# Altium integrated library Jack_LibraryLibPkg.IntLib: 77 symbols (continued)
## BLM18KG300TN1D (continued)
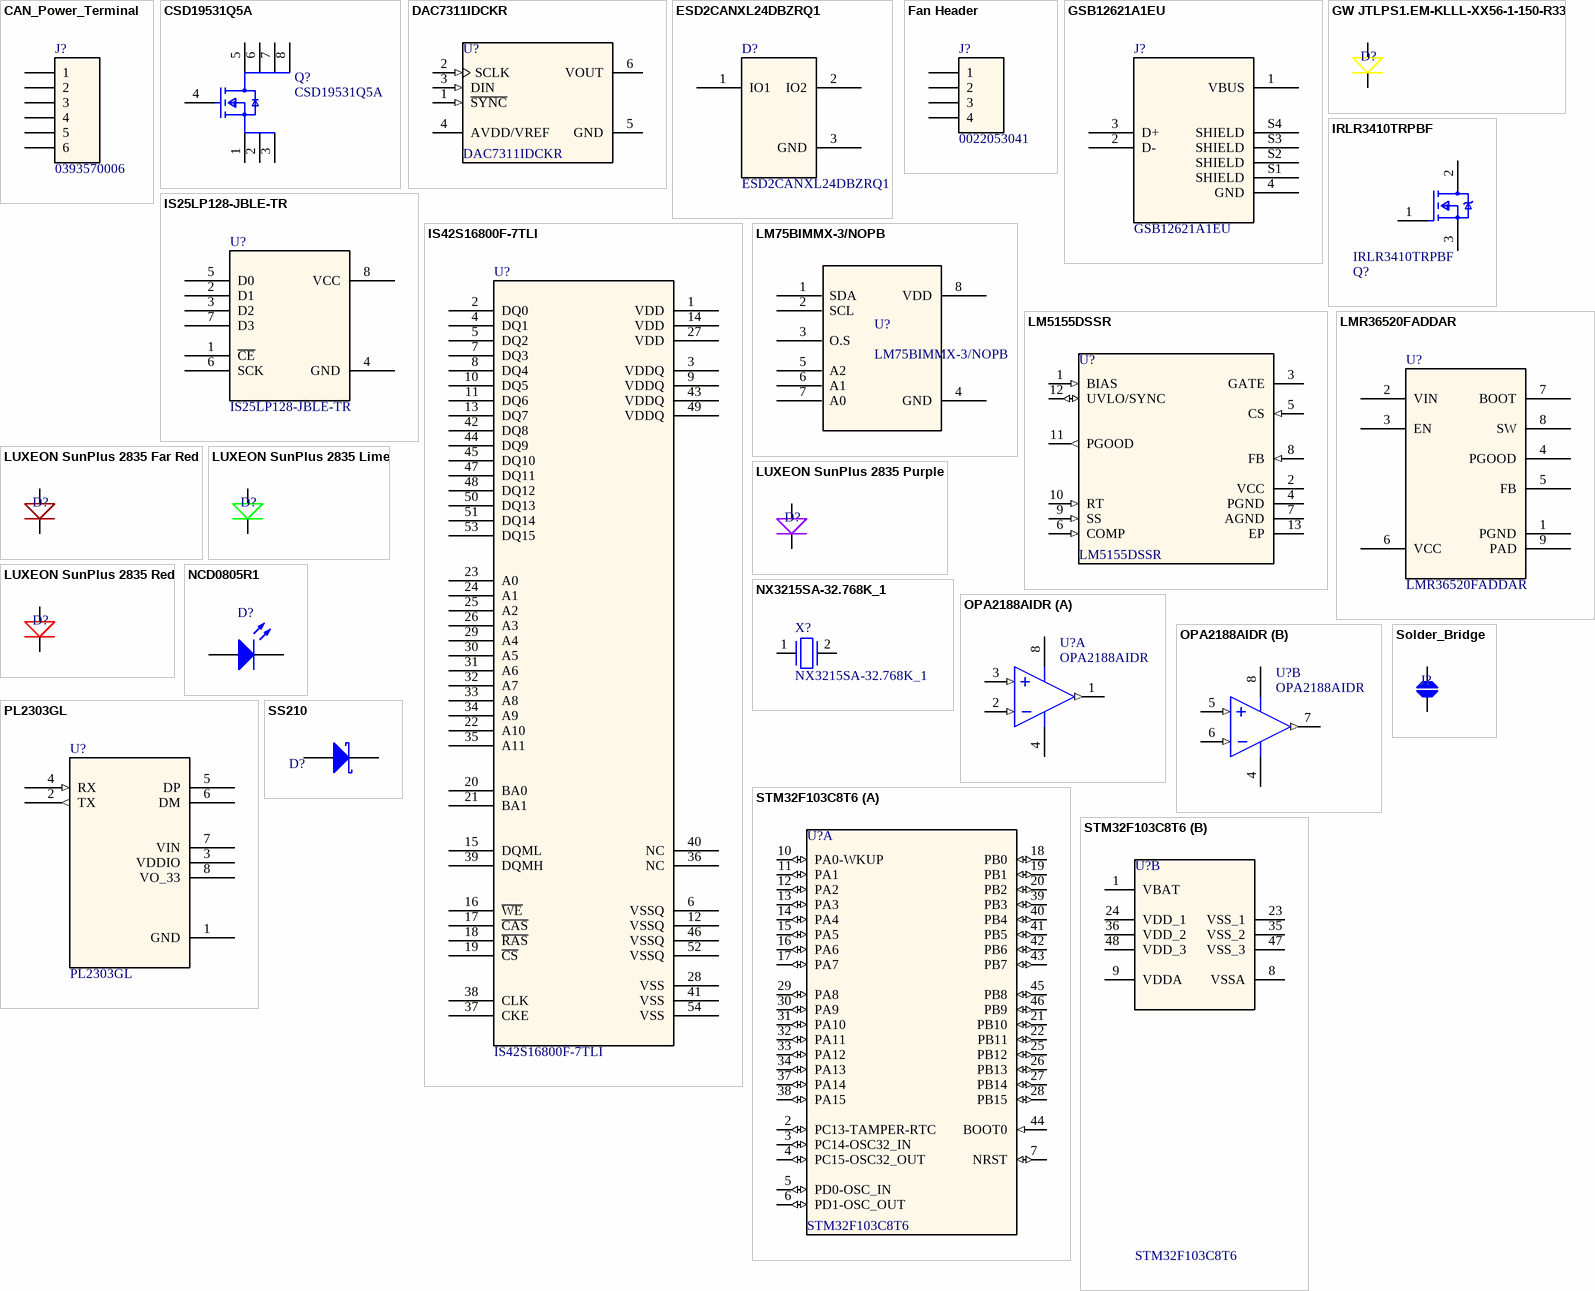
[diagram p1: symbols CAN_Power_Terminal to STM32F103C8T6]

## CAN_Power_Terminal
designator J?, comment 0393570006
TERM BLK 6POS SIDE ENT 3.5MM PCB; Manufacturer: Molex; Supplier: DigiKey; Supplier Part Number: WM7862-ND; Manufacturer Part Number: 0393570006
footprint 0393570006
pins: 1, 2, 3, 4, 5, 6

## CSD19531Q5A
designator Q?
100-V, N channel NexFET™ power MOSFET, single SON 5 mm x 6 mm, 6.4 mOhm 8-VSONP -55 to 150; Manufacturer: Texas Instruments; Supplier: LCSC; Supplier Part Number: C2760462; Manufacturer Part Number: CSD19531Q5A; ComponentLink1URL: https://sigma.octopart.com:443/184372194/technical_drawing/Texas-Instruments-CSD19531Q5A.pdf?src-supplier=Texas+Instruments; ComponentLink1Description: https://sigma.octopart.com:443/184372194/technical_drawing/Texas-Instruments-CSD19531Q5A.pdf?src-supplier=Texas+Instruments; ComponentLink2URL: https://octopart.com:443/opatz8j6/c1?t=wklPcp58AbHJ4RRaLkR_ifwxxo1B96OIbLV_3DJkWUY12fJO0X88PtFSAOnnJMzdG6WrMsvqQlImKIbsu8hNjg8m2aEFgAXbm4nS_JvBiDfw5ETAo9S0EoIyli5B1ETxG5x4AXbPj_3csP9-y79H5Y3ZbsQk7EKptUnDF4cvMOT3mWVC0u0Kzey44HusDK0bIdIT4qYi0o1I_g49QPmTlw9Af_HEZFGI-tsGiPs1daYBaHQQ9yDH4TS0hn7xE1sVlhTeIy_CetF_BRV7Wz_wglmnE115vV0Ji40nlzNiQ8jsfDeTHtAwrBlGENWElmjVY-rFFRUm07X7fH6sac4t_3ZoGwesjdtGRSluLXOCS9-w86h-f3pkmYxXXC9XvGtkKxSXt6AhH6c&src-supplier=Texas+Instruments; ComponentLink2Description: https://octopart.com:443/opatz8j6/c1?t=wklPcp58AbHJ4RRaLkR_ifwxxo1B96OIbLV_3DJkWUY12fJO0X88PtFSAOnnJMzdG6WrMsvqQlImKIbsu8hNjg8m2aEFgAXbm4nS_JvBiDfw5ETAo9S0EoIyli5B1ETxG5x4AXbPj_3csP9-y79H5Y3ZbsQk7EKptUnDF4cvMOT3mWVC0u0Kzey44HusDK0bIdIT4qYi0o1I_g49QPmTlw9Af_HEZFGI-tsGiPs1daYBaHQQ9yDH4TS0hn7xE1sVlhTeIy_CetF_BRV7Wz_wglmnE115vV0Ji40nlzNiQ8jsfDeTHtAwrBlGENWElmjVY-rFFRUm07X7fH6sac4t_3ZoGwesjdtGRSluLXOCS9-w86h-f3pkmYxXXC9XvGtkKxSXt6AhH6c&src-supplier=Texas+Instruments; ComponentLink3URL: https://datasheet.octopart.com:443/CSD19531Q5A-Texas-Instruments-datasheet-24969118.pdf?src-supplier=Texas+Instruments; ComponentLink3Description: https://datasheet.octopart.com:443/CSD19531Q5A-Texas-Instruments-datasheet-24969118.pdf?src-supplier=Texas+Instruments; ComponentLink4URL: https://sigma.octopart.com:443/183468693/technical_drawing/Texas-Instruments-CSD19531Q5A.pdf?src-supplier=Texas+Instruments; ComponentLink4Description: https://sigma.octopart.com:443/183468693/technical_drawing/Texas-Instruments-CSD19531Q5A.pdf?src-supplier=Texas+Instruments; ComponentLink5URL: https://datasheet.octopart.com:443/CSD19531Q5A-Texas-Instruments-datasheet-26532429.pdf?src-supplier=Texas+Instruments; ComponentLink5Description: https://datasheet.octopart.com:443/CSD19531Q5A-Texas-Instruments-datasheet-26532429.pdf?src-supplier=Texas+Instruments; ComponentLink6URL: https://datasheet.octopart.com:443/CSD19531Q5A-Texas-Instruments-datasheet-21773012.pdf?src-supplier=Texas+Instruments; ComponentLink6Description: https://datasheet.octopart.com:443/CSD19531Q5A-Texas-Instruments-datasheet-21773012.pdf?src-supplier=Texas+Instruments; ComponentLink7URL: https://datasheet.octopart.com:443/CSD19531Q5A-Texas-Instruments-datasheet-17852426.pdf?src-supplier=Texas+Instruments; ComponentLink7Description: https://datasheet.octopart.com:443/CSD19531Q5A-Texas-Instruments-datasheet-17852426.pdf?src-supplier=Texas+Instruments; ComponentLink8URL: https://datasheet.octopart.com:443/CSD19531Q5A-Texas-Instruments-datasheet-148780581.pdf?src-supplier=Upverter; ComponentLink8Description: https://datasheet.octopart.com:443/CSD19531Q5A-Texas-Instruments-datasheet-148780581.pdf?src-supplier=Upverter; ComponentLink9URL: https://datasheet.octopart.com:443/CSD19531Q5A-Texas-Instruments-datasheet-62115728.pdf?src-supplier=element14+APAC; ComponentLink9Description: https://datasheet.octopart.com:443/CSD19531Q5A-Texas-Instruments-datasheet-62115728.pdf?src-supplier=element14+APAC; ComponentLink10URL: https://datasheet.octopart.com:443/CSD19531Q5A-Texas-Instruments-datasheet-33010042.pdf?src-supplier=element14+APAC; ComponentLink10Description: https://datasheet.octopart.com:443/CSD19531Q5A-Texas-Instruments-datasheet-33010042.pdf?src-supplier=element14+APAC; ComponentLink11URL: https://datasheet.octopart.com:443/CSD19531Q5A-Texas-Instruments-datasheet-24969116.pdf?src-supplier=Newark; ComponentLink11Description: https://datasheet.octopart.com:443/CSD19531Q5A-Texas-Instruments-datasheet-24969116.pdf?src-supplier=Newark; ComponentLink12URL: https://datasheet.octopart.com:443/CSD19531Q5A-Texas-Instruments-datasheet-163637340.pdf?src-supplier=LCSC; ComponentLink12Description: https://datasheet.octopart.com:443/CSD19531Q5A-Texas-Instruments-datasheet-163637340.pdf?src-supplier=LCSC; ComponentLink13URL: https://datasheet.octopart.com:443/CSD19531Q5A-Texas-Instruments-datasheet-140571322.pdf?src-supplier=Arrow.cn; ComponentLink13Description: https://datasheet.octopart.com:443/CSD19531Q5A-Texas-Instruments-datasheet-140571322.pdf?src-supplier=Arrow.cn; ComponentLink14URL: http://sigma.octopart.com:80/reach_statement/Texas-Instruments-company-64.pdf?src-supplier=Compliance+Statements; ComponentLink14Description: http://sigma.octopart.com:80/reach_statement/Texas-Instruments-company-64.pdf?src-supplier=Compliance+Statements; ComponentLink15URL: http://sigma.octopart.com:80/conflict_mineral_statement/Texas-Instruments-company-63.pdf?src-supplier=Compliance+Statements; ComponentLink15Description: http://sigma.octopart.com:80/conflict_mineral_statement/Texas-Instruments-company-63.pdf?src-supplier=Compliance+Statements
footprint CSD19531Q5A
pins: 1 S, 2 S, 3 S, 4 G, 5 D, 6 D, 7 D, 8 D

## DAC7311IDCKR
designator U?
Serial Input Loading 12 Us Settling Time 12-BIT Dac PDSO6; Manufacturer: Texas Instruments; ComponentLink1URL: http://www.ti.com/; ComponentLink2Description: Datasheet; ComponentLink2URL: http://www.ti.com/general/docs/lit/getliterature.tsp?genericPartNumber=DAC7311&fileType=pdf; ComponentLink3URL: http://www.ti.com/litv/pdf/mpds114c; ComponentLink3Description: Package Specification; ComponentLink1Description: Manufacturer URL; Supplier: LCSC; Supplier Part Number: C128601; Manufacturer Part Number: DAC7311IDCKR; ComponentLink4URL: https://sigma.octopart.com:443/182282881/technical_drawing/Texas-Instruments-DAC7311IDCKR.pdf?src-supplier=Texas+Instruments; ComponentLink4Description: https://sigma.octopart.com:443/182282881/technical_drawing/Texas-Instruments-DAC7311IDCKR.pdf?src-supplier=Texas+Instruments; ComponentLink5URL: https://octopart.com:443/opatz8j6/c1?t=2KETCDy_2XCpEaIION83i5k8TuftEjSi2GbWOw_qo10edj8pd2Ij22i0XVbEVimU3XfT4Dwy0zvRcHo12RtAkjT_lXRETWSaOTN605VKAD_QD9A4F6nS3TQkMeyH6ZNcgf9NmpnLqI4V3ZWtE3fce-K3ksoXvStTjPj_p3eHadMO6FTem4P8suCCBMAeXQ3cF2ZGfAjbjo1W8dQ8sAUqQo2dDJryWNEurCbU8H4mdn4BzXvX04lW5VQAJ7kKqrZqoks6u45qe-rKP5ZE3BXHPvRfjOKJkv7EdPKAAVY2RYnZphVYTAjhEGhvzzmfVTHU90-KdXx7mFsRse6CB8QLNpxBmoATKeWYRKwDC3MqVaFF2J9jNoMCd24YA_VQnpHrqSQzPw&src-supplier=Texas+Instruments; ComponentLink5Description: https://octopart.com:443/opatz8j6/c1?t=2KETCDy_2XCpEaIION83i5k8TuftEjSi2GbWOw_qo10edj8pd2Ij22i0XVbEVimU3XfT4Dwy0zvRcHo12RtAkjT_lXRETWSaOTN605VKAD_QD9A4F6nS3TQkMeyH6ZNcgf9NmpnLqI4V3ZWtE3fce-K3ksoXvStTjPj_p3eHadMO6FTem4P8suCCBMAeXQ3cF2ZGfAjbjo1W8dQ8sAUqQo2dDJryWNEurCbU8H4mdn4BzXvX04lW5VQAJ7kKqrZqoks6u45qe-rKP5ZE3BXHPvRfjOKJkv7EdPKAAVY2RYnZphVYTAjhEGhvzzmfVTHU90-KdXx7mFsRse6CB8QLNpxBmoATKeWYRKwDC3MqVaFF2J9jNoMCd24YA_VQnpHrqSQzPw&src-supplier=Texas+Instruments; ComponentLink6URL: https://datasheet.octopart.com:443/DAC7311IDCKR-Texas-Instruments-datasheet-27379471.pdf?src-supplier=Texas+Instruments; ComponentLink6Description: https://datasheet.octopart.com:443/DAC7311IDCKR-Texas-Instruments-datasheet-27379471.pdf?src-supplier=Texas+Instruments; ComponentLink7URL: https://sigma.octopart.com:443/178868976/technical_drawing/Texas-Instruments-DAC7311IDCKR.pdf?src-supplier=Texas+Instruments; ComponentLink7Description: https://sigma.octopart.com:443/178868976/technical_drawing/Texas-Instruments-DAC7311IDCKR.pdf?src-supplier=Texas+Instruments; ComponentLink8URL: https://datasheet.octopart.com:443/DAC7311IDCKR-Texas-Instruments-datasheet-10283997.pdf?src-supplier=Texas+Instruments; ComponentLink8Description: https://datasheet.octopart.com:443/DAC7311IDCKR-Texas-Instruments-datasheet-10283997.pdf?src-supplier=Texas+Instruments; ComponentLink9URL: https://datasheet.octopart.com:443/DAC7311IDCKR-Texas-Instruments-datasheet-10257199.pdf?src-supplier=Texas+Instruments; ComponentLink9Description: https://datasheet.octopart.com:443/DAC7311IDCKR-Texas-Instruments-datasheet-10257199.pdf?src-supplier=Texas+Instruments; ComponentLink10URL: https://sigma.octopart.com:443/49249328/technical_drawing/Texas-Instruments-DAC7311IDCKR.pdf?src-supplier=Texas+Instruments; ComponentLink10Description: https://sigma.octopart.com:443/49249328/technical_drawing/Texas-Instruments-DAC7311IDCKR.pdf?src-supplier=Texas+Instruments; ComponentLink11URL: https://datasheet.octopart.com:443/DAC7311IDCKR-Texas-Instruments-datasheet-15685715.pdf?src-supplier=Newark; ComponentLink11Description: https://datasheet.octopart.com:443/DAC7311IDCKR-Texas-Instruments-datasheet-15685715.pdf?src-supplier=Newark; ComponentLink12URL: https://datasheet.octopart.com:443/DAC7311IDCKR-Texas-Instruments-datasheet-11536750.pdf?src-supplier=Newark; ComponentLink12Description: https://datasheet.octopart.com:443/DAC7311IDCKR-Texas-Instruments-datasheet-11536750.pdf?src-supplier=Newark; ComponentLink13URL: https://datasheet.octopart.com:443/DAC7311IDCKR-Texas-Instruments-datasheet-48920847.pdf?src-supplier=Upverter; ComponentLink13Description: https://datasheet.octopart.com:443/DAC7311IDCKR-Texas-Instruments-datasheet-48920847.pdf?src-supplier=Upverter; ComponentLink14URL: https://datasheet.octopart.com:443/DAC7311IDCKR-Texas-Instruments-datasheet-159114947.pdf?src-supplier=SHENGYU+ELECTRONICS; ComponentLink14Description: https://datasheet.octopart.com:443/DAC7311IDCKR-Texas-Instruments-datasheet-159114947.pdf?src-supplier=SHENGYU+ELECTRONICS; ComponentLink15URL: https://datasheet.octopart.com:443/DAC7311IDCKR-Texas-Instruments-datasheet-165803864.pdf?src-supplier=LCSC; ComponentLink15Description: https://datasheet.octopart.com:443/DAC7311IDCKR-Texas-Instruments-datasheet-165803864.pdf?src-supplier=LCSC; ComponentLink16URL: https://datasheet.octopart.com:443/DAC7311IDCKR-Texas-Instruments-datasheet-14102677.pdf?src-supplier=iiiC; ComponentLink16Description: https://datasheet.octopart.com:443/DAC7311IDCKR-Texas-Instruments-datasheet-14102677.pdf?src-supplier=iiiC; ComponentLink17URL: http://sigma.octopart.com:80/reach_statement/Texas-Instruments-company-64.pdf?src-supplier=Compliance+Statements; ComponentLink17Description: http://sigma.octopart.com:80/reach_statement/Texas-Instruments-company-64.pdf?src-supplier=Compliance+Statements; ComponentLink18URL: http://sigma.octopart.com:80/conflict_mineral_statement/Texas-Instruments-company-63.pdf?src-supplier=Compliance+Statements; ComponentLink18Description: http://sigma.octopart.com:80/conflict_mineral_statement/Texas-Instruments-company-63.pdf?src-supplier=Compliance+Statements
footprint TI-DCK6_V (SOT23, 6-Leads, Body 2x1.25mm, Pitch 0.65mm)
footprint SOT-363-6 (DAC7311IDCKR) (SOT23, 6-Leads, Body 2.00x2.10mm, Pitch 0.65mm, IPC Medium Density)
pins: 1 ~{SYNC} (in) "Level-triggered control input (active low). This is the frame sychronization signal for the input data. When S\Y\N\C\ goes low, it enables the input shift register and data are transferred in on the falling edges of the (See Datasheet)", 2 SCLK (in) "Serial Clock Input. Data can be transferred at rates up to 50MHz.", 3 DIN (in) "Serial Data Input. Data is clocked into the 24-bit (DAC8411) or 16-bit (DAC8311) input shift register on the falling edge of the serial clock input.", 4 AVDD/VREF (power) "Power Supply Input, +2.0V to 5.5V.", 5 GND (power) "Ground reference point for all circuitry on the part.", 6 VOUT (hiz) "Analog output voltage from DAC. The output amplifier has rail-to-rail operation."

## ESD2CANXL24DBZRQ1
designator D?
Automotive, dual 1.75pF ±24-V ±20-kV ESD protection diode for in-vehicle networks; Manufacturer: Texas Instruments; Supplier: LCSC; Supplier Part Number: C20345393; Manufacturer Part Number: ESD2CANXL24DBZRQ1; ComponentLink1URL: https://sigma.octopart.com:443/179129137/technical_drawing/Texas-Instruments-ESD2CANXL24DBZRQ1.pdf?src-supplier=Texas+Instruments; ComponentLink1Description: https://sigma.octopart.com:443/179129137/technical_drawing/Texas-Instruments-ESD2CANXL24DBZRQ1.pdf?src-supplier=Texas+Instruments; ComponentLink2URL: https://octopart.com:443/opatz8j6/c1?t=lNR_6sRHLPKw7P8s1f-P04G22oHVbNzLWIWsPGfWTXZ9XRQIvcA5wj7aC-3bH0hinutt4AnjL7p6lgyA7lOHjNt8nBmo7xetRU4eexJqdWdGJCmrDm-BWyIS_TvcQf3t1-nq1wS0AqH4-vRTWGrmWgud7pC0fyJDAEbjYJVT_McMvhHa8-DYyuNa33bEgm-4l-4f_LsuvkAfuxVyDYdP7eVVi8b2TRcUoqK1F4h2YfS05PEe3uCTNQAZT15EaK8Rv7aQinqmq15SoS-3EdZkqgYMfTiBeQ057CxLqHSGnbTzgE5D5or64hT-WVm7dN6eS7KK1x9JT8od4UsAxEVxyxTWGLSfv0bhoA6oAuQ233aPK6tgUaVUJzFwomW_15-JhpjxqKHvsXcmqo3K&src-supplier=Texas+Instruments; ComponentLink2Description: https://octopart.com:443/opatz8j6/c1?t=lNR_6sRHLPKw7P8s1f-P04G22oHVbNzLWIWsPGfWTXZ9XRQIvcA5wj7aC-3bH0hinutt4AnjL7p6lgyA7lOHjNt8nBmo7xetRU4eexJqdWdGJCmrDm-BWyIS_TvcQf3t1-nq1wS0AqH4-vRTWGrmWgud7pC0fyJDAEbjYJVT_McMvhHa8-DYyuNa33bEgm-4l-4f_LsuvkAfuxVyDYdP7eVVi8b2TRcUoqK1F4h2YfS05PEe3uCTNQAZT15EaK8Rv7aQinqmq15SoS-3EdZkqgYMfTiBeQ057CxLqHSGnbTzgE5D5or64hT-WVm7dN6eS7KK1x9JT8od4UsAxEVxyxTWGLSfv0bhoA6oAuQ233aPK6tgUaVUJzFwomW_15-JhpjxqKHvsXcmqo3K&src-supplier=Texas+Instruments; ComponentLink3URL: https://sigma.octopart.com:443/169406038/technical_drawing/Texas-Instruments-ESD2CANXL24DBZRQ1.pdf?src-supplier=Texas+Instruments; ComponentLink3Description: https://sigma.octopart.com:443/169406038/technical_drawing/Texas-Instruments-ESD2CANXL24DBZRQ1.pdf?src-supplier=Texas+Instruments; ComponentLink4URL: http://sigma.octopart.com:80/reach_statement/Texas-Instruments-company-64.pdf?src-supplier=Compliance+Statements; ComponentLink4Description: http://sigma.octopart.com:80/reach_statement/Texas-Instruments-company-64.pdf?src-supplier=Compliance+Statements; ComponentLink5URL: http://sigma.octopart.com:80/conflict_mineral_statement/Texas-Instruments-company-63.pdf?src-supplier=Compliance+Statements; ComponentLink5Description: http://sigma.octopart.com:80/conflict_mineral_statement/Texas-Instruments-company-63.pdf?src-supplier=Compliance+Statements
footprint SOT23-3 (SOT23, 3-Leads, Body 2.00x2.10mm, Pitch 0.65mm, IPC Medium Density)
pins: 1 IO1, 2 IO2, 3 GND

## Fan Header
designator J?, comment 0022053041
KK 254 Solid Header, Right-Angle, with Friction Lock, 4 Circuits, Tin (Sn) Plating; Manufacturer: Molex; Supplier: DigiKey; Supplier Part Number: WM4302-ND; Manufacturer Part Number: 22-05-3041; ComponentLink1URL: https://datasheet.octopart.com:443/22-05-3041-Molex-datasheet-138897077.pdf?src-supplier=Upverter; ComponentLink1Description: https://datasheet.octopart.com:443/22-05-3041-Molex-datasheet-138897077.pdf?src-supplier=Upverter; ComponentLink2URL: https://datasheet.octopart.com:443/22-05-3041-Molex-datasheet-10853841.pdf?src-supplier=HQonline; ComponentLink2Description: https://datasheet.octopart.com:443/22-05-3041-Molex-datasheet-10853841.pdf?src-supplier=HQonline; ComponentLink3URL: https://datasheet.octopart.com:443/022053041-Molex-datasheet-8346700.pdf?src-supplier=HQonline; ComponentLink3Description: https://datasheet.octopart.com:443/022053041-Molex-datasheet-8346700.pdf?src-supplier=HQonline; ComponentLink4URL: https://sigma.octopart.com:443/104066300/technical_drawing/Molex-22-05-3041.pdf?src-supplier=IHS; ComponentLink4Description: https://sigma.octopart.com:443/104066300/technical_drawing/Molex-22-05-3041.pdf?src-supplier=IHS; ComponentLink5URL: https://datasheet.octopart.com:443/22-05-3041-Molex-datasheet-13784660.pdf?src-supplier=Molex; ComponentLink5Description: https://datasheet.octopart.com:443/22-05-3041-Molex-datasheet-13784660.pdf?src-supplier=Molex; ComponentLink6URL: https://sigma.octopart.com:443/16295518/technical_drawing/Molex-22-05-3041.pdf?src-supplier=Molex; ComponentLink6Description: https://sigma.octopart.com:443/16295518/technical_drawing/Molex-22-05-3041.pdf?src-supplier=Molex; ComponentLink7URL: https://datasheet.octopart.com:443/22-05-3041-Molex-datasheet-154746875.pdf?src-supplier=JRH+Electronics; ComponentLink7Description: https://datasheet.octopart.com:443/22-05-3041-Molex-datasheet-154746875.pdf?src-supplier=JRH+Electronics; ComponentLink8URL: https://datasheet.octopart.com:443/22-05-3041-Molex-datasheet-101581736.pdf?src-supplier=Farnell; ComponentLink8Description: https://datasheet.octopart.com:443/22-05-3041-Molex-datasheet-101581736.pdf?src-supplier=Farnell; ComponentLink9URL: https://datasheet.octopart.com:443/22-05-3041-Molex-datasheet-11045788.pdf?src-supplier=Farnell; ComponentLink9Description: https://datasheet.octopart.com:443/22-05-3041-Molex-datasheet-11045788.pdf?src-supplier=Farnell; ComponentLink10URL: https://datasheet.octopart.com:443/22-05-3041-Molex-datasheet-8368046.pdf?src-supplier=Farnell; ComponentLink10Description: https://datasheet.octopart.com:443/22-05-3041-Molex-datasheet-8368046.pdf?src-supplier=Farnell; ComponentLink11URL: https://datasheet.octopart.com:443/22-05-3041.-Molex-datasheet-5324252.pdf?src-supplier=Farnell; ComponentLink11Description: https://datasheet.octopart.com:443/22-05-3041.-Molex-datasheet-5324252.pdf?src-supplier=Farnell; ComponentLink12URL: https://datasheet.octopart.com:443/22-05-3041-Molex-datasheet-27709971.pdf?src-supplier=TME; ComponentLink12Description: https://datasheet.octopart.com:443/22-05-3041-Molex-datasheet-27709971.pdf?src-supplier=TME; ComponentLink13URL: https://datasheet.octopart.com:443/22-05-3041-Molex-datasheet-21538492.pdf?src-supplier=Electro+Sonic; ComponentLink13Description: https://datasheet.octopart.com:443/22-05-3041-Molex-datasheet-21538492.pdf?src-supplier=Electro+Sonic; ComponentLink14URL: https://datasheet.octopart.com:443/22-05-3041-Molex-datasheet-62103357.pdf?src-supplier=Electro+Sonic; ComponentLink14Description: https://datasheet.octopart.com:443/22-05-3041-Molex-datasheet-62103357.pdf?src-supplier=Electro+Sonic; ComponentLink15URL: https://datasheet.octopart.com:443/22-05-3041-Molex-datasheet-37168659.pdf?src-supplier=Electro+Sonic; ComponentLink15Description: https://datasheet.octopart.com:443/22-05-3041-Molex-datasheet-37168659.pdf?src-supplier=Electro+Sonic; ComponentLink16URL: https://datasheet.octopart.com:443/22-05-3041-Molex-datasheet-140180755.pdf?src-supplier=RS+(Formerly+Allied+Electronics); ComponentLink16Description: https://datasheet.octopart.com:443/22-05-3041-Molex-datasheet-140180755.pdf?src-supplier=RS+(Formerly+Allied+Electronics); ComponentLink17URL: https://datasheet.octopart.com:443/22-05-3041-Molex-datasheet-9805791.pdf?src-supplier=RS+(Formerly+Allied+Electronics); ComponentLink17Description: https://datasheet.octopart.com:443/22-05-3041-Molex-datasheet-9805791.pdf?src-supplier=RS+(Formerly+Allied+Electronics); ComponentLink18URL: https://datasheet.octopart.com:443/22-05-3041-Molex-datasheet-12970.pdf?src-supplier=RS+(Formerly+Allied+Electronics); ComponentLink18Description: https://datasheet.octopart.com:443/22-05-3041-Molex-datasheet-12970.pdf?src-supplier=RS+(Formerly+Allied+Electronics); ComponentLink19URL: https://datasheet.octopart.com:443/22053041-Molex-datasheet-137316104.pdf?src-supplier=Future+Electronics; ComponentLink19Description: https://datasheet.octopart.com:443/22053041-Molex-datasheet-137316104.pdf?src-supplier=Future+Electronics; ComponentLink20URL: https://datasheet.octopart.com:443/22-05-3041-Molex-datasheet-33002210.pdf?src-supplier=Newark; ComponentLink20Description: https://datasheet.octopart.com:443/22-05-3041-Molex-datasheet-33002210.pdf?src-supplier=Newark; ComponentLink21URL: https://datasheet.octopart.com:443/22-05-3041-Molex-datasheet-21206817.pdf?src-supplier=Newark; ComponentLink21Description: https://datasheet.octopart.com:443/22-05-3041-Molex-datasheet-21206817.pdf?src-supplier=Newark; ComponentLink22URL: https://datasheet.octopart.com:443/22-05-3041-Molex-datasheet-23017.pdf?src-supplier=Newark; ComponentLink22Description: https://datasheet.octopart.com:443/22-05-3041-Molex-datasheet-23017.pdf?src-supplier=Newark; ComponentLink23URL: https://datasheet.octopart.com:443/22-05-3041-Molex-datasheet-8333278.pdf?src-supplier=element14; ComponentLink23Description: https://datasheet.octopart.com:443/22-05-3041-Molex-datasheet-8333278.pdf?src-supplier=element14; ComponentLink24URL: https://datasheet.octopart.com:443/22053041-Molex-datasheet-8209666.pdf?src-supplier=Jameco; ComponentLink24Description: https://datasheet.octopart.com:443/22053041-Molex-datasheet-8209666.pdf?src-supplier=Jameco; ComponentLink25URL: https://datasheet.octopart.com:443/22-05-3041-Molex-datasheet-7272720.pdf?src-supplier=Jameco; ComponentLink25Description: https://datasheet.octopart.com:443/22-05-3041-Molex-datasheet-7272720.pdf?src-supplier=Jameco; ComponentLink26URL: https://datasheet.octopart.com:443/22-05-3041-Molex-datasheet-143055.pdf?src-supplier=DigiKey; ComponentLink26Description: https://datasheet.octopart.com:443/22-05-3041-Molex-datasheet-143055.pdf?src-supplier=DigiKey; ComponentLink27URL: http://sigma.octopart.com:80/16295520/rohs_statement/Molex-22-05-3041.pdf?src-supplier=Compliance+Statements; ComponentLink27Description: http://sigma.octopart.com:80/16295520/rohs_statement/Molex-22-05-3041.pdf?src-supplier=Compliance+Statements; ComponentLink28URL: http://sigma.octopart.com:80/reach_statement/Molex-company-74.pdf?src-supplier=Compliance+Statements; ComponentLink28Description: http://sigma.octopart.com:80/reach_statement/Molex-company-74.pdf?src-supplier=Compliance+Statements; ComponentLink29URL: http://sigma.octopart.com:80/rohs_statement/Molex-company-73.pdf?src-supplier=Compliance+Statements; ComponentLink29Description: http://sigma.octopart.com:80/rohs_statement/Molex-company-73.pdf?src-supplier=Compliance+Statements; ComponentLink30URL: http://sigma.octopart.com:80/conflict_mineral_statement/Molex-company-72.pdf?src-supplier=Compliance+Statements; ComponentLink30Description: http://sigma.octopart.com:80/conflict_mineral_statement/Molex-company-72.pdf?src-supplier=Compliance+Statements
footprint 22053041
pins: 1, 2, 3, 4

## GSB12621A1EU
designator J?
USB2.0 A RECEPT,RIGHT ANGLE, SIN; Manufacturer: Amphenol ICC; Supplier: DigiKey; Supplier Part Number: 664-GSB12621A1EUTR-ND; Manufacturer Part Number: GSB12621A1EU
footprint GSB12621A1EU USB CONNECTOR
pins: 1 VBUS, 2 D-, 3 D+, 4 GND, S1 SHIELD, S2 SHIELD, S3 SHIELD, S4 SHIELD

## GW JTLPS1.EM-KLLL-XX56-1-150-R33
designator D?  (value not drawn)
LED Lighting DURIS® E 2835 White, Warm 3500K 3.05V 150mA 120° 1113 (2835 Metric); Manufacturer: Lumileds; Supplier: DigiKey; Supplier Part Number: 475-GWJTLPS1.EM-KLLL-XX56-1-150-R33CT-ND; Manufacturer Part Number: GW JTLPS1.EM-KLLL-XX56-1-150-R33
footprint GW JTLPS1
pins: A, K

## IRLR3410TRPBF
designator Q?
MOSFET N-CH 100V 17A DPAK N-Channel 100 V 17A (Tc) 79W (Tc) Surface Mount TO-252AA (DPAK); Manufacturer: Infineon; ComponentLink2Description: Datasheet; Manufacturer Part Number: IRLR3410TRPBF; ComponentLink2URL: https://www.infineon.com/dgdl/irlr3410pbf.pdf?fileId=5546d462533600a40153566d14c52695; Supplier: LCSC; Supplier Part Number: C3017; ComponentLink1URL: https://datasheet.octopart.com:443/IRLR3410TRPBF-Infineon-datasheet-5333105.pdf?src-supplier=Newark; ComponentLink1Description: https://datasheet.octopart.com:443/IRLR3410TRPBF-Infineon-datasheet-5333105.pdf?src-supplier=Newark; ComponentLink3URL: https://datasheet.octopart.com:443/IRLR3410TRPBF-Infineon-datasheet-180073437.pdf?src-supplier=Newark; ComponentLink3Description: https://datasheet.octopart.com:443/IRLR3410TRPBF-Infineon-datasheet-180073437.pdf?src-supplier=Newark; ComponentLink4URL: https://datasheet.octopart.com:443/IRLR3410TRPBF-International-Rectifier-datasheet-23783.pdf?src-supplier=Newark; ComponentLink4Description: https://datasheet.octopart.com:443/IRLR3410TRPBF-International-Rectifier-datasheet-23783.pdf?src-supplier=Newark; ComponentLink5URL: https://datasheet.octopart.com:443/IRLR3410TRPBF-International-Rectifier-datasheet-14060032.pdf?src-supplier=iiiC; ComponentLink5Description: https://datasheet.octopart.com:443/IRLR3410TRPBF-International-Rectifier-datasheet-14060032.pdf?src-supplier=iiiC; ComponentLink6URL: http://sigma.octopart.com:80/conflict_mineral_statement/Infineon-company-51.pdf?src-supplier=Compliance+Statements; ComponentLink6Description: http://sigma.octopart.com:80/conflict_mineral_statement/Infineon-company-51.pdf?src-supplier=Compliance+Statements; ComponentLink7URL: http://sigma.octopart.com:80/reach_statement/International-Rectifier-company-55.pdf?src-supplier=Compliance+Statements; ComponentLink7Description: http://sigma.octopart.com:80/reach_statement/International-Rectifier-company-55.pdf?src-supplier=Compliance+Statements; ComponentLink8URL: http://sigma.octopart.com:80/rohs_statement/International-Rectifier-company-54.pdf?src-supplier=Compliance+Statements; ComponentLink8Description: http://sigma.octopart.com:80/rohs_statement/International-Rectifier-company-54.pdf?src-supplier=Compliance+Statements
footprint DPAK_TO_252AA (IRLR3410TRPBF)
pins: 1 G, 2 D, 3 S

## IS25LP128-JBLE-TR
designator U?
NOR Flash Serial (SPI, Dual SPI, Quad SPI) 2.5V/3V/3.3V 128M-bit 16M x 8 8ns 8-Pin SOIC T/R; Manufacturer: ISSI; Supplier: LCSC; Supplier Part Number: C521290; Manufacturer Part Number: IS25LP128-JBLE-TR; ComponentLink1URL: https://datasheet.octopart.com:443/IS25LP128-JBLE-TR-ISSI-datasheet-180100958.pdf?src-supplier=IHS; ComponentLink1Description: https://datasheet.octopart.com:443/IS25LP128-JBLE-TR-ISSI-datasheet-180100958.pdf?src-supplier=IHS; ComponentLink2URL: https://datasheet.octopart.com:443/IS25LP128-JBLE-TR-ISSI-datasheet-138103946.pdf?src-supplier=SHENGYU+ELECTRONICS; ComponentLink2Description: https://datasheet.octopart.com:443/IS25LP128-JBLE-TR-ISSI-datasheet-138103946.pdf?src-supplier=SHENGYU+ELECTRONICS
footprint SOIC8 (SOIC, 8-Leads, Body 5.28x5.28mm, Pitch 1.27mm, IPC Medium Density)
pins: 1 ~{CE}, 2 D1, 3 D2, 4 GND, 5 D0, 6 SCK, 7 D3, 8 VCC

## IS42S16800F-7TLI
designator U?
DRAM Chip SDRAM 128M-Bit 8Mx16 3.3V 54-Pin TSOP-II; Manufacturer: ISSI; Supplier: LCSC; Supplier Part Number: C69411; Manufacturer Part Number: IS42S16800F-7TLI; ComponentLink1URL: https://datasheet.octopart.com:443/IS42S16800F-7TLI-ISSI-datasheet-177144629.pdf?src-supplier=IHS; ComponentLink1Description: https://datasheet.octopart.com:443/IS42S16800F-7TLI-ISSI-datasheet-177144629.pdf?src-supplier=IHS; ComponentLink2URL: https://datasheet.octopart.com:443/IS42S16800F-7TLI-ISSI-datasheet-115062799.pdf?src-supplier=HQonline; ComponentLink2Description: https://datasheet.octopart.com:443/IS42S16800F-7TLI-ISSI-datasheet-115062799.pdf?src-supplier=HQonline; ComponentLink3URL: https://datasheet.octopart.com:443/IS42S16800F-7TLI-ISSI-datasheet-163654484.pdf?src-supplier=Augswan; ComponentLink3Description: https://datasheet.octopart.com:443/IS42S16800F-7TLI-ISSI-datasheet-163654484.pdf?src-supplier=Augswan; ComponentLink4URL: https://datasheet.octopart.com:443/IS42S16800F-7TLI-ISSI-datasheet-11878964.pdf?src-supplier=Arrow+Electronics; ComponentLink4Description: https://datasheet.octopart.com:443/IS42S16800F-7TLI-ISSI-datasheet-11878964.pdf?src-supplier=Arrow+Electronics
footprint TSOP54 (TSOP, 54-Leads, Body 22.22x10.16mm, Pitch 0.80mm, IPC Medium Density)
pins: 1 VDD, 2 DQ0, 3 VDDQ, 4 DQ1, 5 DQ2, 6 VSSQ, 7 DQ3, 8 DQ4, 9 VDDQ, 10 DQ5, 11 DQ6, 12 VSSQ, 13 DQ7, 14 VDD, 15 DQML, 16 ~{WE}, 17 ~{CAS}, 18 ~{RAS}, 19 ~{CS}, 20 BA0, 21 BA1, 22 A10, 23 A0, 24 A1, 25 A2, 26 A3, 27 VDD, 28 VSS, 29 A4, 30 A5, 31 A6, 32 A7, 33 A8, 34 A9, 35 A11, 36 NC, 37 CKE, 38 CLK, 39 DQMH, 40 NC, 41 VSS, 42 DQ8, 43 VDDQ, 44 DQ9, 45 DQ10, 46 VSSQ, 47 DQ11, 48 DQ12, 49 VDDQ, 50 DQ13, 51 DQ14, 52 VSSQ, 53 DQ15, 54 VSS

## LM75BIMMX-3/NOPB
designator U?
-55℃~+125℃ 100ms 3V~5.5V 500nA 9bit I2C ±2℃ VSSOP-8-0.65mm Temperature Sensors ROHS; Manufacturer: Texas Instruments; Supplier: LCSC; Supplier Part Number: C543061; Manufacturer Part Number: LM75BIMMX-3/NOPB
footprint VSSOP8 (LM75BIMMX-3/NOPB) (TSOP, 8-Leads, Body 3.00x3.00mm, Pitch 0.65mm, IPC Medium Density)
pins: 1 SDA, 2 SCL, 3 O.S, 4 GND, 5 A2, 6 A1, 7 A0, 8 VDD

## LM5155DSSR
designator U?
2.2-MHz wide VIN, 1.5-A MOSFET driver, non-synchronous boost controller 12-WSON -40 to 125; Manufacturer: Texas Instruments; Supplier: LCSC; Supplier Part Number: C545416; Manufacturer Part Number: LM5155DSSR; ComponentLink1URL: https://octopart.com:443/opatz8j6/c1?t=c6AIob-Iis5SCHoBiusPCSqKGZ6B3yXO_U7xbhFU7xhSMeB0ZeEkSUNUQrZzrRJP1_k85mtbti4vGlCTcOsXwVX25JijyylDGytaFLaL5gCDTV6azvvJNDFVjU-1MpCvY-npD-y8Wq28vOVWJlIMGaErbmOh13xsk97pF5Oe2TpCHsvXUcof-Z0lbHCwiu-uGpE3CZ7f8b3u_BmxVnUzB-lg6luF278GTWjsnitjY7BOM0TFzqMffBAQyuC6YmAEr1bu-n7HivHCNiNXuB8H3vkZJAyqKEY35f0mmJ1017i2NvX7QV85zrQtzrulQpy6NnYKH1ppxjRNOWBVWR20Kd34QhGDayBEbZEWVyLaYYg5i9WcjOQ8vKKJ561E9IYA2-TIkA&src-supplier=Texas+Instruments; ComponentLink1Description: https://octopart.com:443/opatz8j6/c1?t=c6AIob-Iis5SCHoBiusPCSqKGZ6B3yXO_U7xbhFU7xhSMeB0ZeEkSUNUQrZzrRJP1_k85mtbti4vGlCTcOsXwVX25JijyylDGytaFLaL5gCDTV6azvvJNDFVjU-1MpCvY-npD-y8Wq28vOVWJlIMGaErbmOh13xsk97pF5Oe2TpCHsvXUcof-Z0lbHCwiu-uGpE3CZ7f8b3u_BmxVnUzB-lg6luF278GTWjsnitjY7BOM0TFzqMffBAQyuC6YmAEr1bu-n7HivHCNiNXuB8H3vkZJAyqKEY35f0mmJ1017i2NvX7QV85zrQtzrulQpy6NnYKH1ppxjRNOWBVWR20Kd34QhGDayBEbZEWVyLaYYg5i9WcjOQ8vKKJ561E9IYA2-TIkA&src-supplier=Texas+Instruments; ComponentLink2URL: https://sigma.octopart.com:443/81678663/technical_drawing/Texas-Instruments-LM5155DSSR.pdf?src-supplier=Texas+Instruments; ComponentLink2Description: https://sigma.octopart.com:443/81678663/technical_drawing/Texas-Instruments-LM5155DSSR.pdf?src-supplier=Texas+Instruments; ComponentLink3URL: https://datasheet.octopart.com:443/LM5155DSSR-Texas-Instruments-datasheet-151051505.pdf?src-supplier=Upverter; ComponentLink3Description: https://datasheet.octopart.com:443/LM5155DSSR-Texas-Instruments-datasheet-151051505.pdf?src-supplier=Upverter; ComponentLink4URL: http://sigma.octopart.com:80/reach_statement/Texas-Instruments-company-64.pdf?src-supplier=Compliance+Statements; ComponentLink4Description: http://sigma.octopart.com:80/reach_statement/Texas-Instruments-company-64.pdf?src-supplier=Compliance+Statements; ComponentLink5URL: http://sigma.octopart.com:80/conflict_mineral_statement/Texas-Instruments-company-63.pdf?src-supplier=Compliance+Statements; ComponentLink5Description: http://sigma.octopart.com:80/conflict_mineral_statement/Texas-Instruments-company-63.pdf?src-supplier=Compliance+Statements
footprint WSON12 (LM5155DSSR) (SON, 12-Leads, Body 3.00x2.00mm, Pitch 0.50mm, Thermal Pad 2.65x0.79mm, IPC Medium Density)
pins: 1 BIAS (in), 2 VCC (power), 3 GATE, 4 PGND (power), 5 CS (in), 6 COMP (in), 7 AGND (power), 8 FB (in), 9 SS (in), 10 RT (in), 11 PGOOD (out), 12 UVLO/SYNC (io), 13 EP (power)

## LMR36520FADDAR
designator U?
IC REG BUCK ADJ 2A 8SOPWR "Buck Switching Regulator IC Positive Adjustable 1V 1 Output 2A 8-PowerSOIC (0.154"",...; Manufacturer: Texas Instruments; Supplier: LCSC; Supplier Part Number: C1858395; Manufacturer Part Number: LMR36520FADDAR; ComponentLink1URL: https://sigma.octopart.com:443/104526336/technical_drawing/Texas-Instruments-LMR36520FADDAR.pdf?src-supplier=Texas+Instruments; ComponentLink1Description: https://sigma.octopart.com:443/104526336/technical_drawing/Texas-Instruments-LMR36520FADDAR.pdf?src-supplier=Texas+Instruments; ComponentLink2URL: https://octopart.com:443/opatz8j6/c1?t=mHbzaQ1Tht0UV9nehfg5JiUnlsE_g6jEQZu4cgLsz7FdSPytCj4GT_8w8awNCG6PeU6TxqmtEJrkUBGGJyvku2gjVBep4h00nAZ89dcXKNnd2gG9g6d4C5g0wp9xiQcjuA7ti1nzwa8x6zdLsfl0B3HqFDAGiJbSO8y9Ls0L_BPMX5u4Slhfpg6UDt9-0_9nl2Xjgzq1NNSuayRbQs-ujVhBD533bHdfFlc8CK607Dk82q2-Km0ow_-B3-tyW-LMsF-2gB6GxyOaUT341cgLMJHM3d0VyX_1JRL2UCDs5TRoGisOmXnK4bktZIfSp2ik0ZADK5Vy-TlIZkce9k04I79soOuKbQPdC4RFs6ama8YLpD5h656EQwzMTtUILFiaUT_aq65E-A&src-supplier=Texas+Instruments; ComponentLink2Description: https://octopart.com:443/opatz8j6/c1?t=mHbzaQ1Tht0UV9nehfg5JiUnlsE_g6jEQZu4cgLsz7FdSPytCj4GT_8w8awNCG6PeU6TxqmtEJrkUBGGJyvku2gjVBep4h00nAZ89dcXKNnd2gG9g6d4C5g0wp9xiQcjuA7ti1nzwa8x6zdLsfl0B3HqFDAGiJbSO8y9Ls0L_BPMX5u4Slhfpg6UDt9-0_9nl2Xjgzq1NNSuayRbQs-ujVhBD533bHdfFlc8CK607Dk82q2-Km0ow_-B3-tyW-LMsF-2gB6GxyOaUT341cgLMJHM3d0VyX_1JRL2UCDs5TRoGisOmXnK4bktZIfSp2ik0ZADK5Vy-TlIZkce9k04I79soOuKbQPdC4RFs6ama8YLpD5h656EQwzMTtUILFiaUT_aq65E-A&src-supplier=Texas+Instruments; ComponentLink3URL: http://sigma.octopart.com:80/reach_statement/Texas-Instruments-company-64.pdf?src-supplier=Compliance+Statements; ComponentLink3Description: http://sigma.octopart.com:80/reach_statement/Texas-Instruments-company-64.pdf?src-supplier=Compliance+Statements; ComponentLink4URL: http://sigma.octopart.com:80/conflict_mineral_statement/Texas-Instruments-company-63.pdf?src-supplier=Compliance+Statements; ComponentLink4Description: http://sigma.octopart.com:80/conflict_mineral_statement/Texas-Instruments-company-63.pdf?src-supplier=Compliance+Statements
footprint SOIC8 with thermal pad (SOIC, 8-Leads, Body 4.90x3.90mm, Pitch 1.27mm, Thermal Pad 3.40x2.71mm, IPC Low Density)
pins: 1 PGND, 2 VIN, 3 EN, 4 PGOOD, 5 FB, 6 VCC, 7 BOOT, 8 SW, 9 PAD

## LUXEON SunPlus 2835 Far Red
designator D?  (value not drawn)
LED Lighting Color LUXEON SunPlus 2835 Horticulture Red 730nm (720nm ~ 740nm) 1411 (3528 Metric); Manufacturer: Lumileds; Manufacturer Part Number: L1SP-FRD0002800000; Supplier: DigiKey; Supplier Part Number: 1416-2055-1-ND
footprint LUXEON SunPlus 2835 - Far Red
pins: A, K

## LUXEON SunPlus 2835 Lime
designator D?  (value not drawn)
LED Lighting Color LUXEON SunPlus 2835 Horticulture Lime 1411 (3528 Metric); Manufacturer: Lumileds; Manufacturer Part Number: L1SP-LME0002800000; Supplier: DigiKey; Supplier Part Number: 1416-2057-1-ND
footprint LUXEON SunPlus 2835 - Lime
pins: A, K

## LUXEON SunPlus 2835 Purple
designator D?  (value not drawn)
LED Lighting Color LUXEON SunPlus 2835 Horticulture Purple 1411 (3528 Metric); Manufacturer: Lumileds; Manufacturer Part Number: L1SP-PRP2002800000; Supplier: DigiKey; Supplier Part Number: 1416-2059-1-ND
footprint LUXEON SunPlus 2835 - Purple
pins: A, K

## LUXEON SunPlus 2835 Red
designator D?  (value not drawn)
LED Lighting Color LUXEON SunPlus 2835 Horticulture Red 660nm (650nm ~ 670nm) 1411 (3528 Metric); Manufacturer: Lumileds; Manufacturer Part Number: L1SP-DRD0002800000; Supplier: DigiKey; Supplier Part Number: 1416-2056-2-ND
footprint LUXEON SunPlus 2835 - Red
pins: A, K

## NCD0805R1
designator D?  (value not drawn)
-30℃~+85℃ 1.6V~2.6V 130° 195mcd 25mA 615nm~630nm 630nm 65mW Discrete Diode Red 0805 LED Indication - Discrete ROHS; Manufacturer: Foshan NationStar Optoelectronics; Supplier: LCSC; Supplier Part Number: C84256; Manufacturer Part Number: NCD0805R1
footprint 0805 LED (Chip LED. 2-Leads, Body 2.00x1.25mm, IPC Medium Density)
pins: 1 A, 2 K

## NX3215SA-32.768K_1
designator X?
Crystal 0.032768MHz ±20ppm (Tol) 12.5pF FUND 70000Ohm 2-Pin SMD T/R Automotive AEC-Q200; Manufacturer: NDK; Manufacturer Part Number: NX3215SA-32.768K-STD-MUA-8; Supplier: LCSC; Supplier Part Number: C156245; ComponentLink1URL: https://datasheet.octopart.com:443/NX3215SA-32.768K-STD-MUA-8-NDK-datasheet-155922648.pdf?src-supplier=IHS; ComponentLink1Description: https://datasheet.octopart.com:443/NX3215SA-32.768K-STD-MUA-8-NDK-datasheet-155922648.pdf?src-supplier=IHS; ComponentLink2URL: https://datasheet.octopart.com:443/NX3215SA-32.768K-STD-MUA-8-NDK-datasheet-141422411.pdf?src-supplier=Upverter; ComponentLink2Description: https://datasheet.octopart.com:443/NX3215SA-32.768K-STD-MUA-8-NDK-datasheet-141422411.pdf?src-supplier=Upverter; ComponentLink3URL: https://datasheet.octopart.com/NX3215SA-32.768K-STD-MUA-8-NDK-datasheet-16193215.pdf; ComponentLink3Description: https://datasheet.octopart.com/NX3215SA-32.768K-STD-MUA-8-NDK-datasheet-16193215.pdf
footprint 3.2x1.5x0.8mm Crystal
pins: 1, 2

## OPA2188AIDR
designator U?
IC OPAMP ZERO-DRIFT 2 CIRC 8SOIC Zero-Drift Amplifier 2 Circuit Rail-to-Rail 8-SOIC; Manufacturer: Texas Instruments; ComponentLink2Description: Datasheet; ComponentLink1URL: http://www.ti.com/; ComponentLink3Description: Package Specification; ComponentLink1Description: Manufacturer URL; ComponentLink2URL: http://www.ti.com/lit/ds/symlink/opa2188.pdf; ComponentLink3URL: http://www.ti.com/litv/pdf/msoi002j; Supplier: LCSC; Supplier Part Number: C17271; Manufacturer Part Number: OPA2188AIDR; ComponentLink4URL: https://datasheet.octopart.com:443/OPA2188AIDR-Texas-Instruments-datasheet-21222635.pdf?src-supplier=Texas+Instruments; ComponentLink4Description: https://datasheet.octopart.com:443/OPA2188AIDR-Texas-Instruments-datasheet-21222635.pdf?src-supplier=Texas+Instruments; ComponentLink5URL: https://octopart.com:443/opatz8j6/c1?t=IMri9aKVNKnNSJe6QKdhpKUAswEjm9itsrwZiWD12ZA2sfxNDFSoS1fdlpT1GHkTnAEWFlwDjaTZizx3BKk4Dlz1a3ZXhKDAWlmcgRSCliu4MlGwQG4Bg6vwBhFDGn2h4NPHb6a7RNYKZICKPgNUpywepHMPoRno59HQ-f8BAYTZTcejTqE_mg9HZQSSyNt_QNZmYQ7VeXiD2fW5XUMJLX2otfViFjAkFALPfYXiyRVQHiczSOa6cVebPhWbe0i6weLxeTtvHA6DtgnGr1O0tSnmslFh1pZdJIJiachky7kzBCc13hCJ-_2ba7FA5oCeo_5n8LGHI3V_S6frgRdPIU8DSYwNxP0iHszQlm7RQCpEylVr3bG6QuIh9GJlnpL-jvtbGxM&src-supplier=Texas+Instruments; ComponentLink5Description: https://octopart.com:443/opatz8j6/c1?t=IMri9aKVNKnNSJe6QKdhpKUAswEjm9itsrwZiWD12ZA2sfxNDFSoS1fdlpT1GHkTnAEWFlwDjaTZizx3BKk4Dlz1a3ZXhKDAWlmcgRSCliu4MlGwQG4Bg6vwBhFDGn2h4NPHb6a7RNYKZICKPgNUpywepHMPoRno59HQ-f8BAYTZTcejTqE_mg9HZQSSyNt_QNZmYQ7VeXiD2fW5XUMJLX2otfViFjAkFALPfYXiyRVQHiczSOa6cVebPhWbe0i6weLxeTtvHA6DtgnGr1O0tSnmslFh1pZdJIJiachky7kzBCc13hCJ-_2ba7FA5oCeo_5n8LGHI3V_S6frgRdPIU8DSYwNxP0iHszQlm7RQCpEylVr3bG6QuIh9GJlnpL-jvtbGxM&src-supplier=Texas+Instruments; ComponentLink6URL: https://datasheet.octopart.com:443/OPA2188AIDR-Texas-Instruments-datasheet-12081918.pdf?src-supplier=Texas+Instruments; ComponentLink6Description: https://datasheet.octopart.com:443/OPA2188AIDR-Texas-Instruments-datasheet-12081918.pdf?src-supplier=Texas+Instruments; ComponentLink7URL: https://datasheet.octopart.com:443/OPA2188AIDR-Texas-Instruments-datasheet-11516531.pdf?src-supplier=Texas+Instruments; ComponentLink7Description: https://datasheet.octopart.com:443/OPA2188AIDR-Texas-Instruments-datasheet-11516531.pdf?src-supplier=Texas+Instruments; ComponentLink8URL: https://sigma.octopart.com:443/49249642/technical_drawing/Texas-Instruments-OPA2188AIDR.pdf?src-supplier=Texas+Instruments; ComponentLink8Description: https://sigma.octopart.com:443/49249642/technical_drawing/Texas-Instruments-OPA2188AIDR.pdf?src-supplier=Texas+Instruments; ComponentLink9URL: https://datasheet.octopart.com:443/OPA2188AIDR-Texas-Instruments-datasheet-16079768.pdf?src-supplier=Upverter; ComponentLink9Description: https://datasheet.octopart.com:443/OPA2188AIDR-Texas-Instruments-datasheet-16079768.pdf?src-supplier=Upverter; ComponentLink10URL: https://datasheet.octopart.com:443/OPA2188AIDR-Texas-Instruments-datasheet-65713359.pdf?src-supplier=element14+APAC; ComponentLink10Description: https://datasheet.octopart.com:443/OPA2188AIDR-Texas-Instruments-datasheet-65713359.pdf?src-supplier=element14+APAC; ComponentLink11URL: https://datasheet.octopart.com:443/OPA2188AIDR-Texas-Instruments-datasheet-61210595.pdf?src-supplier=Newark; ComponentLink11Description: https://datasheet.octopart.com:443/OPA2188AIDR-Texas-Instruments-datasheet-61210595.pdf?src-supplier=Newark; ComponentLink12URL: https://datasheet.octopart.com:443/OPA2188AIDR-Texas-Instruments-datasheet-165804230.pdf?src-supplier=LCSC; ComponentLink12Description: https://datasheet.octopart.com:443/OPA2188AIDR-Texas-Instruments-datasheet-165804230.pdf?src-supplier=LCSC; ComponentLink13URL: https://datasheet.octopart.com:443/OPA2188AIDR-Texas-Instruments-datasheet-159115565.pdf?src-supplier=LCSC; ComponentLink13Description: https://datasheet.octopart.com:443/OPA2188AIDR-Texas-Instruments-datasheet-159115565.pdf?src-supplier=LCSC; ComponentLink14URL: https://datasheet.octopart.com:443/OPA2188AIDR-Texas-Instruments-datasheet-140571586.pdf?src-supplier=Arrow.cn; ComponentLink14Description: https://datasheet.octopart.com:443/OPA2188AIDR-Texas-Instruments-datasheet-140571586.pdf?src-supplier=Arrow.cn; ComponentLink15URL: https://datasheet.octopart.com:443/OPA2188AIDR-Texas-Instruments-datasheet-11889666.pdf?src-supplier=Arrow+Electronics; ComponentLink15Description: https://datasheet.octopart.com:443/OPA2188AIDR-Texas-Instruments-datasheet-11889666.pdf?src-supplier=Arrow+Electronics; ComponentLink16URL: http://sigma.octopart.com:80/reach_statement/Texas-Instruments-company-64.pdf?src-supplier=Compliance+Statements; ComponentLink16Description: http://sigma.octopart.com:80/reach_statement/Texas-Instruments-company-64.pdf?src-supplier=Compliance+Statements; ComponentLink17URL: http://sigma.octopart.com:80/conflict_mineral_statement/Texas-Instruments-company-63.pdf?src-supplier=Compliance+Statements; ComponentLink17Description: http://sigma.octopart.com:80/conflict_mineral_statement/Texas-Instruments-company-63.pdf?src-supplier=Compliance+Statements